# Altium footprint library ARCOM_Chips.PcbLib: 185 footprints (part 6 of 12)
Each footprint in its own frame and in the unit in brackets; x right, y up, seen from the top. Pads: shape width x height; smd on the part's side, far side on the other; paste and mask are expansions set on the pad; w line width, h text height; cw(c..) or ccw(c..) is an arc to the next point about the centre after c.
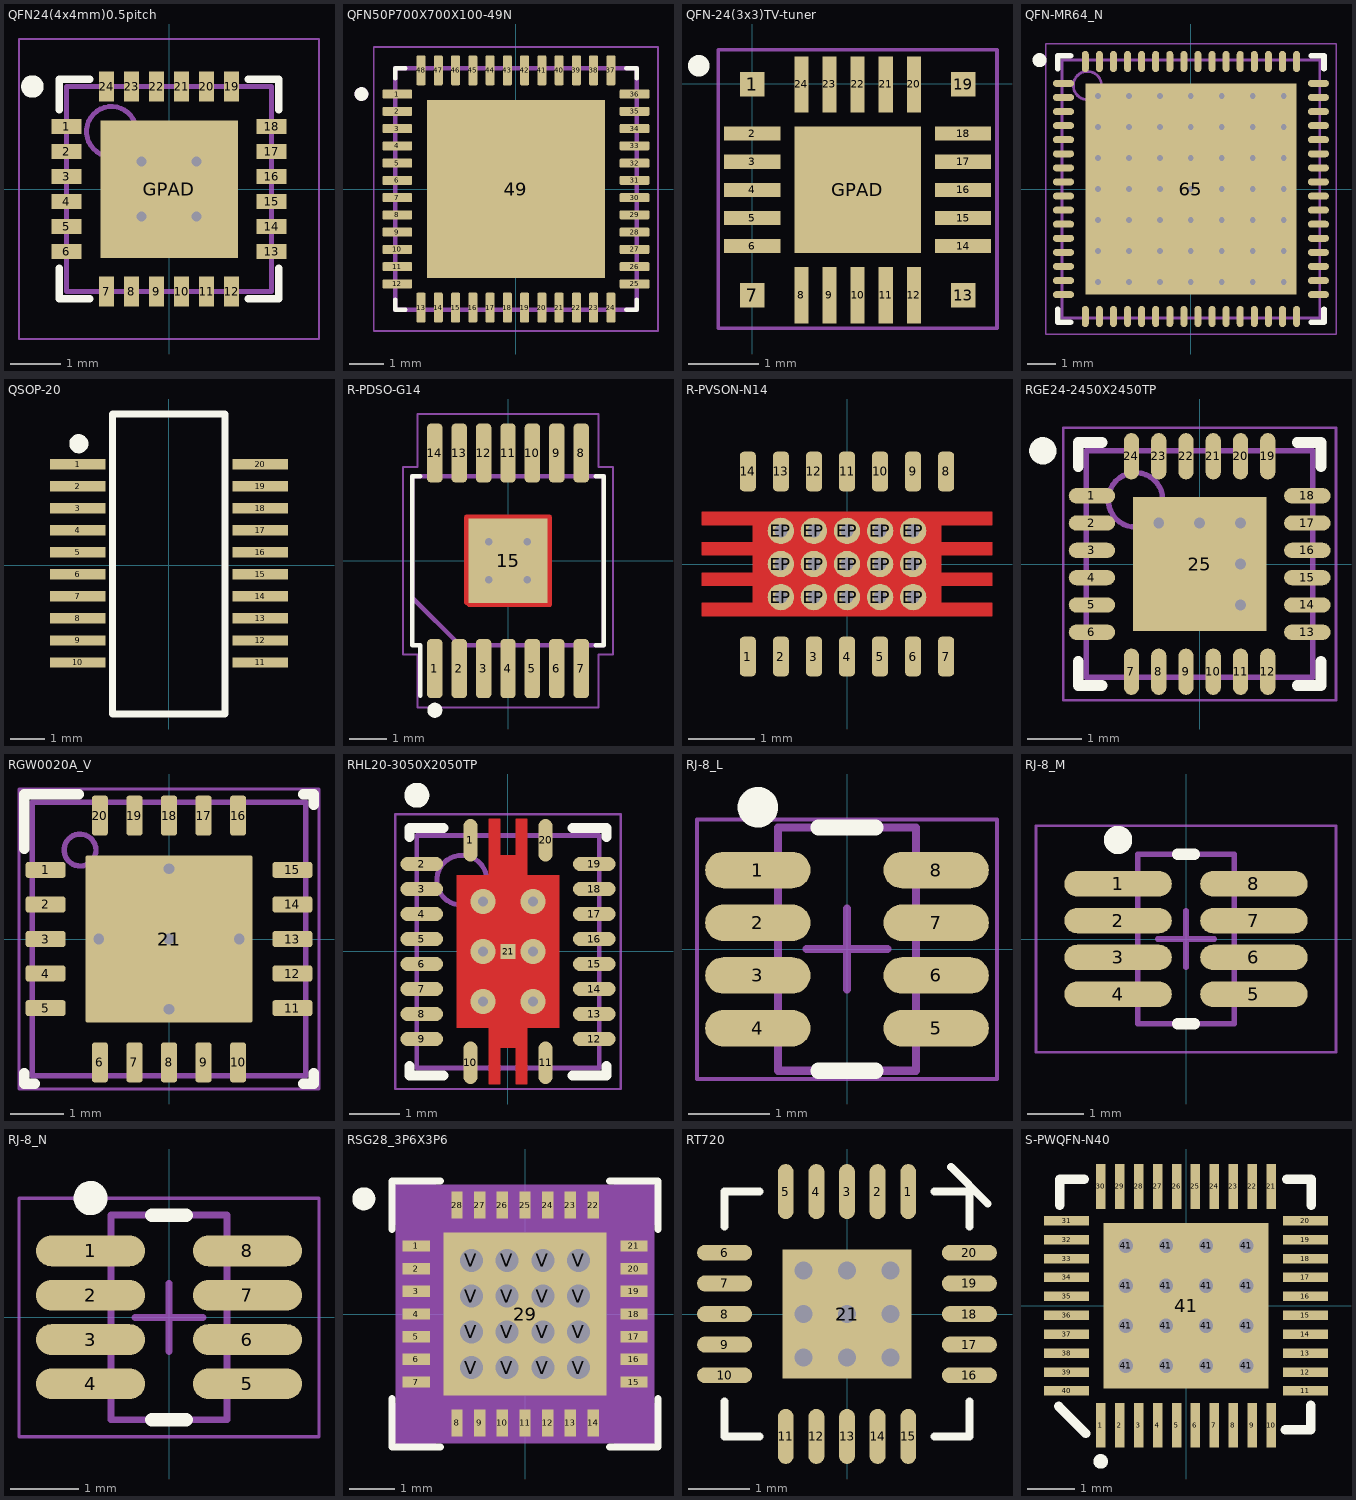
[diagram p5: the footprints below, top view; thin cyan lines are the x and y axes]

## QFN24(4x4mm)0.5pitch [mm]
pads (25):
  rect 0.6x0.3 smd mask+0.051: 1(-2.05,1.25) 2(-2.05,0.75) 3(-2.05,0.25) 4(-2.05,-0.25) 5(-2.05,-0.75) 6(-2.05,-1.25) 13(2.05,-1.25) 14(2.05,-0.75) 15(2.05,-0.25) 16(2.05,0.25) 17(2.05,0.75) 18(2.05,1.25)
  rect 0.3x0.6 smd mask+0.051: 7(-1.25,-2.05) 8(-0.75,-2.05) 9(-0.25,-2.05) 10(0.25,-2.05) 11(0.75,-2.05) 12(1.25,-2.05) 19(1.25,2.05) 20(0.75,2.05) 21(0.25,2.05) 22(-0.25,2.05) 23(-0.75,2.05) 24(-1.25,2.05)
  rect 2.75x2.75 smd mask+0.051: GPAD(0,0)
via -0.55,0.55 diameter 0.5 hole 0.2
via 0.55,0.55 diameter 0.5 hole 0.2
via -0.55,-0.55 diameter 0.5 hole 0.2
via 0.55,-0.55 diameter 0.5 hole 0.2
Top Overlay:
  circle w0.25: c-2.733,2.05 r0.1
  lines w0.15: -2.2,-1.582 -2.2,-2.2 -1.582,-2.2 ; -2.2,1.582 -2.2,2.2 -1.582,2.2 ; 1.582,-2.2 2.2,-2.2 2.2,-1.582 ; 1.582,2.2 2.2,2.2 2.2,1.582
Mechanical 13:
  circle w0.1: c-1.15,1.15 r0.5
  lines w0.1: -2.05,-2.05 -2.05,2.05 2.05,2.05 2.05,-2.05 -2.05,-2.05
M15 Top Assy:
  lines w0.05: -3,-3 -3,3 3,3 3,-3 -3,-3
  lines w0.1: -0.5,0 0.5,0 ; 0,-0.5 0,0.5
3D body "User Library-QFN 24 4x4.STEP": height 0.9, standoff 0, extent -2.002,-1.992 2.002,2.012

## QFN50P700X700X100-49N [mm]
pads (49):
  rrect25% 0.86x0.26 smd: 1(-3.435,2.75) 2(-3.435,2.25) 3(-3.435,1.75) 4(-3.435,1.25) 5(-3.435,0.75) 6(-3.435,0.25) 7(-3.435,-0.25) 8(-3.435,-0.75) 9(-3.435,-1.25) 10(-3.435,-1.75) 11(-3.435,-2.25) 12(-3.435,-2.75) 25(3.435,-2.75) 26(3.435,-2.25) 27(3.435,-1.75) 28(3.435,-1.25) 29(3.435,-0.75) 30(3.435,-0.25) 31(3.435,0.25) 32(3.435,0.75) 33(3.435,1.25) 34(3.435,1.75) 35(3.435,2.25) 36(3.435,2.75)
  rrect25% 0.26x0.86 smd: 13(-2.75,-3.435) 14(-2.25,-3.435) 15(-1.75,-3.435) 16(-1.25,-3.435) 17(-0.75,-3.435) 18(-0.25,-3.435) 19(0.25,-3.435) 20(0.75,-3.435) 21(1.25,-3.435) 22(1.75,-3.435) 23(2.25,-3.435) 24(2.75,-3.435) 37(2.75,3.435) 38(2.25,3.435) 39(1.75,3.435) 40(1.25,3.435) 41(0.75,3.435) 42(0.25,3.435) 43(-0.25,3.435) 44(-0.75,3.435) 45(-1.25,3.435) 46(-1.75,3.435) 47(-2.25,3.435) 48(-2.75,3.435)
  rect 5.15x5.15 smd paste-4: 49(0,0)
Top Overlay:
  circle w0.2: c-4.475,2.75 r0.1
  lines w0.127: -3.5,-3.2 -3.5,-3.5 -3.2,-3.5 ; -3.5,3.2 -3.5,3.5 -3.2,3.5 ; 3.2,-3.5 3.5,-3.5 3.5,-3.2 ; 3.2,3.5 3.5,3.5 3.5,3.2
Top Paste:
  region: 2.1,-2.1 0.48,-2.1 0.48,-0.48 2.1,-0.48
  region: -0.48,-2.1 -2.1,-2.1 -2.1,-0.48 -0.48,-0.48
  region: 2.1,0.48 0.48,0.48 0.48,2.1 2.1,2.1
  region: -0.48,0.48 -2.1,0.48 -2.1,2.1 -0.48,2.1
Mechanical 13:
  circle w0.2: c-4.475,2.75 r0.1
  lines w0.127: -3.5,-3.5 -3.5,3.5 3.5,3.5 3.5,-3.5 -3.5,-3.5
M15 Top Assy:
  lines w0.05: -4.115,-4.115 -4.115,4.115 4.115,4.115 4.115,-4.115 -4.115,-4.115
3D body "RGZ0048D.stp": height 1, standoff 0, extent -3.5,-3.5 3.5,3.5

## QFN-24(3x3)TV-tuner [mm]
pads (25):
  rect 0.35x0.35 smd mask+0.076: 1(-0.003,-0.011) 7(-0.003,-3.011) 13(2.997,-3.011) 19(2.997,-0.011)
  rect 0.8x0.2 smd mask+0.076: 2(-0.003,-0.711) 3(-0.003,-1.111) 4(-0.003,-1.511) 5(-0.003,-1.911) 6(-0.003,-2.311) 14(2.997,-2.311) 15(2.997,-1.911) 16(2.997,-1.511) 17(2.997,-1.111) 18(2.997,-0.711)
  rect 0.2x0.8 smd mask+0.076: 8(0.697,-3.011) 9(1.097,-3.011) 10(1.497,-3.011) 11(1.897,-3.011) 12(2.297,-3.011) 20(2.297,-0.011) 21(1.897,-0.011) 22(1.497,-0.011) 23(1.097,-0.011) 24(0.697,-0.011)
  rect 1.8x1.8 smd mask+0.076: GPAD(1.497,-1.511)
Top Overlay:
  circle w0.254: c-0.762,0.254 r0.025
M15 Top Assy:
  lines w0.05: -0.483,-3.48 3.48,-3.48 3.48,0.483 -0.483,0.483 -0.483,-3.48
  lines w0.1: 0.999,-1.524 1.999,-1.524 ; 1.499,-2.024 1.499,-1.024

## QFN-MR64_N [mm] "QFN, 64-Leads, Body 9x9mm, Pitch 0.5mm, Thermal Pad 7.5x7.5mm, IPC Medium Density"
height 1
pads (65):
  oval 0.75x0.25 smd: 1(-4.525,3.75) 2(-4.525,3.25) 3(-4.525,2.75) 4(-4.525,2.25) 5(-4.525,1.75) 6(-4.525,1.25) 7(-4.525,0.75) 8(-4.525,0.25) 9(-4.525,-0.25) 10(-4.525,-0.75) 11(-4.525,-1.25) 12(-4.525,-1.75) 13(-4.525,-2.25) 14(-4.525,-2.75) 15(-4.525,-3.25) 16(-4.525,-3.75) 33(4.525,-3.75) 34(4.525,-3.25) 35(4.525,-2.75) 36(4.525,-2.25) 37(4.525,-1.75) 38(4.525,-1.25) 39(4.525,-0.75) 40(4.525,-0.25) 41(4.525,0.25) 42(4.525,0.75) 43(4.525,1.25) 44(4.525,1.75) 45(4.525,2.25) 46(4.525,2.75) 47(4.525,3.25) 48(4.525,3.75)
  oval 0.25x0.75 smd: 17(-3.75,-4.525) 18(-3.25,-4.525) 19(-2.75,-4.525) 20(-2.25,-4.525) 21(-1.75,-4.525) 22(-1.25,-4.525) 23(-0.75,-4.525) 24(-0.25,-4.525) 25(0.25,-4.525) 26(0.75,-4.525) 27(1.25,-4.525) 28(1.75,-4.525) 29(2.25,-4.525) 30(2.75,-4.525) 31(3.25,-4.525) 32(3.75,-4.525) 49(3.75,4.525) 50(3.25,4.525) 51(2.75,4.525) 52(2.25,4.525) 53(1.75,4.525) 54(1.25,4.525) 55(0.75,4.525) 56(0.25,4.525) 57(-0.25,4.525) 58(-0.75,4.525) 59(-1.25,4.525) 60(-1.75,4.525) 61(-2.25,4.525) 62(-2.75,4.525) 63(-3.25,4.525) 64(-3.75,4.525)
  rect 7.5x7.5 smd: 65(0,0)
via -3.3,3.3 diameter 0.5 hole 0.2
via -2.2,3.3 diameter 0.5 hole 0.2
via -1.1,3.3 diameter 0.5 hole 0.2
via 0,3.3 diameter 0.5 hole 0.2
via 1.1,3.3 diameter 0.5 hole 0.2
via 2.2,3.3 diameter 0.5 hole 0.2
via 3.3,3.3 diameter 0.5 hole 0.2
via -3.3,2.2 diameter 0.5 hole 0.2
via -2.2,2.2 diameter 0.5 hole 0.2
via -1.1,2.2 diameter 0.5 hole 0.2
via 0,2.2 diameter 0.5 hole 0.2
via 1.1,2.2 diameter 0.5 hole 0.2
via 2.2,2.2 diameter 0.5 hole 0.2
via 3.3,2.2 diameter 0.5 hole 0.2
via -3.3,1.1 diameter 0.5 hole 0.2
via -2.2,1.1 diameter 0.5 hole 0.2
via -1.1,1.1 diameter 0.5 hole 0.2
via 0,1.1 diameter 0.5 hole 0.2
via 1.1,1.1 diameter 0.5 hole 0.2
via 2.2,1.1 diameter 0.5 hole 0.2
via 3.3,1.1 diameter 0.5 hole 0.2
via -3.3,0 diameter 0.5 hole 0.2
via -2.2,0 diameter 0.5 hole 0.2
via -1.1,0 diameter 0.5 hole 0.2
via 0,0 diameter 0.5 hole 0.2
via 1.1,0 diameter 0.5 hole 0.2
via 2.2,0 diameter 0.5 hole 0.2
via 3.3,0 diameter 0.5 hole 0.2
via -3.3,-1.1 diameter 0.5 hole 0.2
via -2.2,-1.1 diameter 0.5 hole 0.2
via -1.1,-1.1 diameter 0.5 hole 0.2
via 0,-1.1 diameter 0.5 hole 0.2
via 1.1,-1.1 diameter 0.5 hole 0.2
via 2.2,-1.1 diameter 0.5 hole 0.2
via 3.3,-1.1 diameter 0.5 hole 0.2
via -3.3,-2.2 diameter 0.5 hole 0.2
via -2.2,-2.2 diameter 0.5 hole 0.2
via -1.1,-2.2 diameter 0.5 hole 0.2
via 0,-2.2 diameter 0.5 hole 0.2
via 1.1,-2.2 diameter 0.5 hole 0.2
via 2.2,-2.2 diameter 0.5 hole 0.2
via 3.3,-2.2 diameter 0.5 hole 0.2
via -3.3,-3.3 diameter 0.5 hole 0.2
via -2.2,-3.3 diameter 0.5 hole 0.2
via -1.1,-3.3 diameter 0.5 hole 0.2
via 0,-3.3 diameter 0.5 hole 0.2
via 1.1,-3.3 diameter 0.5 hole 0.2
via 2.2,-3.3 diameter 0.5 hole 0.2
via 3.3,-3.3 diameter 0.5 hole 0.2
Top Overlay:
  circle w0.25: c-5.375,4.575 r0.125
  lines w0.2: -4.725,-4.275 -4.725,-4.725 -4.275,-4.725 ; -4.725,4.275 -4.725,4.725 -4.275,4.725 ; 4.275,-4.725 4.725,-4.725 4.725,-4.275 ; 4.275,4.725 4.725,4.725 4.725,4.275
Mechanical 13:
  circle w0.1: c-3.675,3.675 r0.5
  lines w0.1: -4.575,-4.575 -4.575,4.575 4.575,4.575 4.575,-4.575 -4.575,-4.575
M15 Top Assy:
  lines w0.05: -5.15,-5.15 -5.15,5.15 5.15,5.15 5.15,-5.15 -5.15,-5.15
  lines w0.1: -0.5,0 0.5,0 ; 0,-0.5 0,0.5
3D body: height 1, standoff 0, extent -4.575,-4.575 4.575,4.575

## QSOP-20 [mm]
pads (20):
  rect 1.6x0.3 smd: 1(-2.625,2.913) 2(-2.625,2.278) 3(-2.625,1.643) 4(-2.625,1.008) 5(-2.625,0.373) 6(-2.625,-0.262) 7(-2.625,-0.897) 8(-2.625,-1.532) 9(-2.625,-2.167) 10(-2.625,-2.802) 11(2.64,-2.802) 12(2.64,-2.167) 13(2.64,-1.532) 14(2.64,-0.897) 15(2.64,-0.262) 16(2.64,0.373) 17(2.64,1.008) 18(2.64,1.643) 19(2.64,2.278) 20(2.64,2.913)
Top Overlay:
  circle w0.3: c-2.592,3.506 r0.125
  lines w0.2: -1.625,-4.287 1.625,-4.287 1.625,4.363 -1.625,4.363 -1.625,-4.287

## R-PDSO-G14 [mm]
pads (15):
  rrect50% 0.41x1.57 smd paste-25.4 mask-25.4: 1(-1.95,-2.87) 2(-1.3,-2.87) 3(-0.65,-2.87) 4(0,-2.87) 5(0.65,-2.87) 6(1.3,-2.87) 7(1.95,-2.87) 8(1.95,2.87) 9(1.3,2.87) 10(0.65,2.87) 11(0,2.87) 12(-0.65,2.87) 13(-1.3,2.87) 14(-1.95,2.87)
  rect 2.11x2.26 smd mask-25.4: 15(0,0)
via -0.508,0.508 diameter 0.5 hole 0.2
via 0.508,0.508 diameter 0.5 hole 0.2
via 0.508,-0.508 diameter 0.5 hole 0.2
via -0.508,-0.508 diameter 0.5 hole 0.2
Top Layer:
  region: 1.16,0 1.16,-1.18 1.15,-1.19 1.15,-1.2 1.15,-1.21 1.14,-1.22 1.13,-1.22 1.12,-1.23 1.11,-1.23 -1.06,-1.23 -1.16,-1.13 -1.16,1.18 -1.15,1.19 -1.15,1.2 -1.15,1.21 -1.14,1.22 -1.13,1.22 -1.12,1.23 -1.11,1.23 1.1,1.23 1.11,1.23 1.12,1.23 1.13,1.22 1.14,1.22 1.15,1.21 1.15,1.2 1.15,1.19 1.16,1.18
Top Overlay:
  circle w0.2: c-1.95,-3.98 r0.1
  lines w0.12: -2.34,-3.6 -2.34,-2.25 -2.55,-2.25 -2.55,2.25 -2.34,2.25 ; 2.34,-2.25 2.55,-2.25 2.55,2.25 2.34,2.25
Top Paste:
  drawing of 18 lines, arcs and shapes, not listed
Top Solder:
  drawing of 16 lines, arcs and shapes, not listed
Mechanical 1:
  lines w0.12: -2.55,-0.98 -2.55,2.25 2.55,2.25 2.55,-2.25 -1.28,-2.25 -2.55,-0.98
M16 Bot Assy:
  circle w0.05: c0,0 r0.25
  lines w0.05: -0.35,0 0.35,0 ; 0,-0.35 0,0.35 ; -2.8,-2.5 -2.8,2.5 -2.41,2.5 -2.41,3.91 2.41,3.91 2.41,2.5 2.8,2.5 2.8,-2.5 2.41,-2.5 2.41,-3.91 -2.41,-3.91 -2.41,-2.5 -2.8,-2.5

## R-PVSON-N14 [mm]
pads (29):
  rrect50% 0.24x0.6 smd mask+0.07: 1(-1.5,-1.4) 2(-1,-1.4) 3(-0.5,-1.4) 4(0,-1.4) 5(0.5,-1.4) 6(1,-1.4) 7(1.5,-1.4) 8(1.5,1.4) 9(1,1.4) 10(0.5,1.4) 11(0,1.4) 12(-0.5,1.4) 13(-1,1.4) 14(-1.5,1.4)
  round 0.4 hole 0.2 mask-1: EP(-1,-0.5) EP(-1,0) EP(-1,0.5) EP(-0.5,-0.5) EP(-0.5,0) EP(-0.5,0.5) EP(0,-0.5) EP(0,0) EP(0,0.5) EP(0.5,-0.5) EP(0.5,0) EP(0.5,0.5) EP(1,-0.5) EP(1,0) EP(1,0.5)
Top Layer:
  region: -2.2,0.79 -2.2,0.59 -1.425,0.59 -1.425,0.33 -2.2,0.33 -2.2,0.13 -1.425,0.13 -1.425,-0.13 -2.2,-0.13 -2.2,-0.33 -1.425,-0.33 -1.425,-0.59 -2.2,-0.59 -2.2,-0.79 2.2,-0.79 2.2,-0.59 1.425,-0.59 1.425,-0.33 2.2,-0.33 2.2,-0.13 1.425,-0.13 1.425,0.13 2.2,0.13 2.2,0.33 1.425,0.33 1.425,0.59 2.2,0.59 2.2,0.79
Top Paste:
  region: -2.2,0.79 -2.2,0.59 -1.425,0.59 -1.425,0.33 -2.2,0.33 -2.2,0.13 -1.425,0.13 -1.425,-0.13 -2.2,-0.13 -2.2,-0.33 -1.425,-0.33 -1.425,-0.59 -2.2,-0.59 -2.2,-0.79 2.2,-0.79 2.2,-0.59 1.425,-0.59 1.425,-0.33 2.2,-0.33 2.2,-0.13 1.425,-0.13 1.425,0.13 2.2,0.13 2.2,0.33 1.425,0.33 1.425,0.59 2.2,0.59 2.2,0.79
Top Solder:
  region: -2.27,0.86 -2.27,0.52 -1.495,0.52 -1.495,0.4 -2.27,0.4 -2.27,0.06 -1.495,0.06 -1.495,-0.06 -2.27,-0.06 -2.27,-0.4 -1.495,-0.4 -1.495,-0.52 -2.27,-0.52 -2.27,-0.86 2.27,-0.86 2.27,-0.52 1.495,-0.52 1.495,-0.4 2.27,-0.4 2.27,-0.06 1.495,-0.06 1.495,0.06 2.27,0.06 2.27,0.4 1.495,0.4 1.495,0.52 2.27,0.52 2.27,0.86
3D body "User Library-R-PVSON-N14.STEP": height 1.05, standoff 0, extent -2.077,-1.587 2.077,1.587

## RGE24-2450X2450TP [mm] "QFN, 24-Leads, Body 4x4mm, Pitch 0.5mm, Thermal Pad 2.45x2.45mm, TI Recommended"
height 1
pads (25):
  oval 0.85x0.28 smd paste-0.025 mask+0.07: 1(-1.975,1.25) 2(-1.975,0.75) 3(-1.975,0.25) 4(-1.975,-0.25) 5(-1.975,-0.75) 6(-1.975,-1.25) 13(1.975,-1.25) 14(1.975,-0.75) 15(1.975,-0.25) 16(1.975,0.25) 17(1.975,0.75) 18(1.975,1.25)
  oval 0.28x0.85 smd paste-0.025 mask+0.07: 7(-1.25,-1.975) 8(-0.75,-1.975) 9(-0.25,-1.975) 10(0.25,-1.975) 11(0.75,-1.975) 12(1.25,-1.975) 19(1.25,1.975) 20(0.75,1.975) 21(0.25,1.975) 22(-0.25,1.975) 23(-0.75,1.975) 24(-1.25,1.975)
  rect 2.45x2.45 smd paste-1.225 mask+0.07: 25(0,0)
via 0.75,0.75 diameter 0.5 hole 0.2
via 0.75,0 diameter 0.5 hole 0.2
via -0.75,0.75 diameter 0.5 hole 0.2
via 0,0.75 diameter 0.5 hole 0.2
via 0.75,-0.75 diameter 0.5 hole 0.2
Top Overlay:
  circle w0.25: c-2.875,2.075 r0.125
  lines w0.2: -2.225,-1.79 -2.225,-2.225 -1.79,-2.225 ; -2.225,1.79 -2.225,2.225 -1.79,2.225 ; 1.79,-2.225 2.225,-2.225 2.225,-1.79 ; 1.79,2.225 2.225,2.225 2.225,1.79
Top Paste:
  rectangle: 0.15,-1.15 1.15,-0.15
  region: -0.15,-0.15 -1.15,-0.15 -1.15,-1.15 -0.15,-1.15
  region: -0.15,1.15 -1.15,1.15 -1.15,0.15 -0.15,0.15
  rectangle: 0.15,0.15 1.15,1.15
Mechanical 13:
  circle w0.1: c-1.175,1.175 r0.5
  lines w0.1: -2.075,-2.075 -2.075,2.075 2.075,2.075 2.075,-2.075 -2.075,-2.075
M15 Top Assy:
  lines w0.05: -2.5,-2.5 -2.5,2.5 2.5,2.5 2.5,-2.5 -2.5,-2.5
  lines w0.1: -0.5,0 0.5,0 ; 0,-0.5 0,0.5
3D body: height 1, standoff 0, extent -2.075,-2.075 2.075,2.075

## RGW0020A_V [mm] "QFN, 20-Leads, Body 5x5mm, Pitch 0.65mm, Thermal Pad 3.15x3.15mm, TI Recommended"
height 1
pads (21):
  rrect33% 0.75x0.3 smd: 1(-2.325,1.3) 2(-2.325,0.65) 3(-2.325,0) 4(-2.325,-0.65) 5(-2.325,-1.3) 11(2.325,-1.3) 12(2.325,-0.65) 13(2.325,0) 14(2.325,0.65) 15(2.325,1.3)
  rrect33% 0.3x0.75 smd: 6(-1.3,-2.325) 7(-0.65,-2.325) 8(0,-2.325) 9(0.65,-2.325) 10(1.3,-2.325) 16(1.3,2.325) 17(0.65,2.325) 18(0,2.325) 19(-0.65,2.325) 20(-1.3,2.325)
  rrect3% 3.15x3.15 smd paste-1.575: 21(0,0)
via 0,1.325 diameter 0.5 hole 0.2
via -1.325,0 diameter 0.5 hole 0.2
via 0,0 diameter 0.5 hole 0.2
via 1.325,0 diameter 0.5 hole 0.2
via 0,-1.325 diameter 0.5 hole 0.2
Top Overlay:
  lines w0.2: -2.725,-2.525 -2.725,-2.725 -2.525,-2.725 ; -2.725,1.7 -2.725,2.725 -1.7,2.725 ; 2.525,-2.725 2.725,-2.725 2.725,-2.525 ; 2.525,2.725 2.725,2.725 2.725,2.525
Top Paste:
  rectangle: 0.1,0.1 1.468,1.468
  region: -0.1,1.468 -1.468,1.468 -1.468,0.1 -0.1,0.1
  region: -0.1,-0.1 -1.468,-0.1 -1.468,-1.468 -0.1,-1.468
  rectangle: 0.1,-1.468 1.468,-0.1
Mechanical 1:
  text ".Designator" at -1.854,-0.508 h1.02
Mechanical 13:
  circle w0.1: c-1.675,1.675 r0.3
  lines w0.1: -2.575,-2.575 -2.575,2.575 2.575,2.575 2.575,-2.575 -2.575,-2.575
M15 Top Assy:
  lines w0.05: -2.825,-2.825 2.825,-2.825 2.825,2.825 -2.825,2.825 -2.825,-2.825
  lines w0.1: -0.5,0 0.5,0 ; 0,-0.5 0,0.5
3D body: height 1.01, standoff 0.5, extent -1.974,1.376 -1.376,1.974
3D body: height 1, standoff 0, extent -2.575,-2.575 2.575,2.575

## RHL20-3050X2050TP [mm] "QFN, 20-Leads, Body 4.5x3.5mm, Pitch 0.5mm, Thermal Pad 3.05x2.05mm, TI Recommended"
height 1
pads (21):
  oval 0.28x0.85 smd paste-0.025 mask+0.051: 1(-0.75,2.225) 10(-0.75,-2.225) 11(0.75,-2.225) 20(0.75,2.225)
  oval 0.85x0.28 smd paste-0.025 mask+0.051: 2(-1.725,1.75) 3(-1.725,1.25) 4(-1.725,0.75) 5(-1.725,0.25) 6(-1.725,-0.25) 7(-1.725,-0.75) 8(-1.725,-1.25) 9(-1.725,-1.75) 12(1.725,-1.75) 13(1.725,-1.25) 14(1.725,-0.75) 15(1.725,-0.25) 16(1.725,0.25) 17(1.725,0.75) 18(1.725,1.25) 19(1.725,1.75)
  rect 0.3x0.3 smd paste-0.15 mask+0.051: 21(0,0)
via -0.5,1 diameter 0.5 hole 0.2
via -0.5,0 diameter 0.5 hole 0.2
via -0.5,-1 diameter 0.5 hole 0.2
via 0.5,1 diameter 0.5 hole 0.2
via 0.5,0 diameter 0.5 hole 0.2
via 0.5,-1 diameter 0.5 hole 0.2
Top Layer:
  region: 0.16,2.65 0.16,1.925 -0.16,1.925 -0.16,2.65 -0.39,2.65 -0.39,1.525 -1.025,1.525 -1.025,-1.525 -0.39,-1.525 -0.39,-2.65 -0.16,-2.65 -0.16,-1.925 0.16,-1.925 0.16,-2.65 0.39,-2.65 0.39,-1.525 1.025,-1.525 1.025,1.525 0.39,1.525 0.39,2.65
Top Overlay:
  circle w0.25: c-1.825,3.125 r0.125
  lines w0.2: -1.975,-2.29 -1.975,-2.475 -1.29,-2.475 ; -1.975,2.29 -1.975,2.475 -1.29,2.475 ; 1.29,-2.475 1.975,-2.475 1.975,-2.29 ; 1.29,2.475 1.975,2.475 1.975,2.29
Top Paste:
  region: -0.39,2.625 -0.39,1.725 -0.16,1.725 -0.16,2.625
  region: -0.16,-2.625 -0.16,-1.725 -0.39,-1.725 -0.39,-2.625
  region: 0.16,2.625 0.16,1.725 0.39,1.725 0.39,2.625
  region: 0.39,-2.625 0.39,-1.725 0.16,-1.725 0.16,-2.625
  region: -0.97,1.47 -0.97,0.15 -0.15,0.15 -0.15,1.47
  region: -0.15,-1.47 -0.15,-0.15 -0.97,-0.15 -0.97,-1.47
  region: 0.97,-1.47 0.97,-0.15 0.15,-0.15 0.15,-1.47
  region: 0.15,1.47 0.15,0.15 0.97,0.15 0.97,1.47
Mechanical 13:
  circle w0.1: c-0.925,1.425 r0.5
  lines w0.1: -1.825,-2.325 1.825,-2.325 1.825,2.325 -1.825,2.325 -1.825,-2.325
M15 Top Assy:
  lines w0.05: -2.25,-2.75 2.25,-2.75 2.25,2.75 -2.25,2.75 -2.25,-2.75
  lines w0.1: -0.5,0 0.5,0 ; 0,-0.5 0,0.5
3D body: height 1, standoff 0, extent -1.825,-2.325 1.825,2.325

## RJ-8_L [mm] "SOP, 8-Leads, Body 2.9x1.6mm, Pitch 0.65mm, IPC High Density"
height 1.45
pads (8):
  oval 1.3x0.45 smd: 1(-1.1,0.975) 2(-1.1,0.325) 3(-1.1,-0.325) 4(-1.1,-0.975) 5(1.1,-0.975) 6(1.1,-0.325) 7(1.1,0.325) 8(1.1,0.975)
Top Overlay:
  circle w0.25: c-1.1,1.75 r0.125
  lines w0.2: -0.35,-1.5 0.35,-1.5 ; -0.35,1.5 0.35,1.5
Mechanical 13:
  lines w0.1: -0.85,-1.5 -0.85,1.5 0.85,1.5 0.85,-1.5 -0.85,-1.5
M15 Top Assy:
  lines w0.05: -1.85,-1.6 -1.85,1.6 1.85,1.6 1.85,-1.6 -1.85,-1.6
  lines w0.1: -0.5,0 0.5,0 ; 0,-0.5 0,0.5
3D body: height 1.45, standoff 0.05, extent -0.85,-1.5 0.85,1.5

## RJ-8_M [mm] "SOP, 8-Leads, Body 2.9x1.6mm, Pitch 0.65mm, IPC Low Density"
height 1.45
pads (8):
  oval 1.9x0.45 smd: 1(-1.2,0.975) 2(-1.2,0.325) 3(-1.2,-0.325) 4(-1.2,-0.975) 5(1.2,-0.975) 6(1.2,-0.325) 7(1.2,0.325) 8(1.2,0.975)
Top Overlay:
  circle w0.25: c-1.2,1.75 r0.125
  lines w0.2: -0.15,-1.5 0.15,-1.5 ; -0.15,1.5 0.15,1.5
Mechanical 13:
  lines w0.1: -0.85,-1.5 0.85,-1.5 0.85,1.5 -0.85,1.5 -0.85,-1.5
M15 Top Assy:
  lines w0.05: -2.65,-2 2.65,-2 2.65,2 -2.65,2 -2.65,-2
  lines w0.1: -0.5,0 0.5,0 ; 0,-0.5 0,0.5
3D body: height 1.45, standoff 0.05, extent -0.85,-1.5 0.85,1.5

## RJ-8_N [mm] "SOP, 8-Leads, Body 2.9x1.6mm, Pitch 0.65mm, IPC Medium Density"
height 1.45
pads (8):
  oval 1.6x0.45 smd: 1(-1.15,0.975) 2(-1.15,0.325) 3(-1.15,-0.325) 4(-1.15,-0.975) 5(1.15,-0.975) 6(1.15,-0.325) 7(1.15,0.325) 8(1.15,0.975)
Top Overlay:
  circle w0.25: c-1.15,1.75 r0.125
  lines w0.2: -0.25,-1.5 0.25,-1.5 ; -0.25,1.5 0.25,1.5
Mechanical 13:
  lines w0.1: -0.85,-1.5 0.85,-1.5 0.85,1.5 -0.85,1.5 -0.85,-1.5
M15 Top Assy:
  lines w0.05: -2.2,-1.75 2.2,-1.75 2.2,1.75 -2.2,1.75 -2.2,-1.75
  lines w0.1: -0.5,0 0.5,0 ; 0,-0.5 0,0.5
3D body: height 1.45, standoff 0.05, extent -0.85,-1.5 0.85,1.5

## RSG28_3P6X3P6 [mm]
pads (45):
  rect 0.6x0.25 smd paste-0.125: 1(-2.4,1.5) 2(-2.4,1) 3(-2.4,0.5) 4(-2.4,0) 5(-2.4,-0.5) 6(-2.4,-1) 7(-2.4,-1.5) 15(2.4,-1.5) 16(2.4,-1) 17(2.4,-0.5) 18(2.4,0) 19(2.4,0.5) 20(2.4,1) 21(2.4,1.5)
  rect 0.25x0.6 smd paste-0.125: 8(-1.5,-2.4) 9(-1,-2.4) 10(-0.5,-2.4) 11(0,-2.4) 12(0.5,-2.4) 13(1,-2.4) 14(1.5,-2.4) 22(1.5,2.4) 23(1,2.4) 24(0.5,2.4) 25(0,2.4) 26(-0.5,2.4) 27(-1,2.4) 28(-1.5,2.4)
  rect 3.6x3.6 smd paste-1.787 mask-1.791: 29(0,0)
  round 1.016 / inner round 1.524 / far side round 1.016 hole 0.508: V(-1.181,-1.181) V(-1.181,-0.394) V(-1.181,0.394) V(-1.181,1.181) V(-0.394,-1.181) V(-0.394,-0.394) V(-0.394,0.394) V(-0.394,1.181) V(0.394,-1.181) V(0.394,-0.394) V(0.394,0.394) V(0.394,1.181) V(1.181,-1.181) V(1.181,-0.394) V(1.181,0.394) V(1.181,1.181)
Top Overlay:
  circle w0.254: c-3.556,2.54 r0.127
  lines w0.152: -2.931,-1.864 -2.931,-2.931 -1.864,-2.931 ; -2.931,1.864 -2.931,2.931 -1.864,2.931 ; 1.864,-2.931 2.931,-2.931 2.931,-1.864 ; 1.864,2.931 2.931,2.931 2.931,1.864
Top Paste:
  drawing of 53 lines, arcs and shapes, not listed
Top Solder:
  drawing of 38 lines, arcs and shapes, not listed
Mechanical 13:
  text ".Designator" at -2.667,0 h1.27
M15 Top Assy:
  region: -2.008,-2.804 -2.804,-2.804 -2.804,-2.008 -2.779,-2.008 -2.779,2.008 -2.804,2.008 -2.804,2.804 -2.008,2.804 -2.008,2.779 2.008,2.779 2.008,2.804 2.804,2.804 2.804,2.008 2.779,2.008 2.779,-2.008 2.804,-2.008 2.804,-2.804 2.008,-2.804 2.008,-2.779 -2.008,-2.779
  lines w0.152: -2.804,-2.804 -2.804,-2.008 -2.779,-2.008 -2.779,2.008 -2.804,2.008 -2.804,2.804 -2.008,2.804 -2.008,2.779 2.008,2.779 2.008,2.804 2.804,2.804 2.804,2.008 2.779,2.008 2.779,-2.008 2.804,-2.008 2.804,-2.804 2.008,-2.804 2.008,-2.779 -2.008,-2.779 -2.008,-2.804 -2.804,-2.804
3D body "RSG28_3P6X3P6.stp": height 1.4, standoff 0, extent -2.601,-2.601 2.601,2.601

## RT720 [mm]
pads (21):
  oval 0.26x0.9 smd: 1(1,2) 2(0.5,2) 3(0,2) 4(-0.5,2) 5(-1,2) 11(-1,-2) 12(-0.5,-2) 13(0,-2) 14(0.5,-2) 15(1,-2)
  oval 0.9x0.26 smd: 6(-2,1) 7(-2,0.5) 8(-2,0) 9(-2,-0.5) 10(-2,-1) 16(2,-1) 17(2,-0.5) 18(2,0) 19(2,0.5) 20(2,1)
  rect 2.1x2.1 / inner round 0 / far side rect 2.55x2.55 all layers, no hole mask+0.102: 21(0,0)
via 0.711,0 diameter 0.5 hole 0.3
via 0,-0.711 diameter 0.5 hole 0.3
via -0.711,0 diameter 0.5 hole 0.3
via 0,0.711 diameter 0.5 hole 0.3
via 0,0 diameter 0.5 hole 0.3
via 0.711,-0.711 diameter 0.5 hole 0.3
via -0.711,-0.711 diameter 0.5 hole 0.3
via 0.711,0.711 diameter 0.5 hole 0.3
via -0.711,0.711 diameter 0.5 hole 0.3
Top Overlay:
  lines w0.127: -2,-1.429 -2,-2 -1.429,-2 ; -2,1.429 -2,2 -1.429,2 ; 1.429,-2 2,-2 2,-1.429 ; 1.429,2 2,2 2,1.429 ; 1.7,2.4 2.3,1.8
3D body "User Library-QFN20_050.STEP": height 0.9, standoff 0, extent -2.005,-2.005 2.005,2.005

## S-PWQFN-N40 [mm]
pads (57):
  rect 0.2x0.95 smd: 1(-1.8,-2.525) 2(-1.4,-2.525) 3(-1,-2.525) 4(-0.6,-2.525) 5(-0.2,-2.525) 6(0.2,-2.525) 7(0.6,-2.525) 8(1,-2.525) 9(1.4,-2.525) 10(1.8,-2.525) 21(1.8,2.525) 22(1.4,2.525) 23(1,2.525) 24(0.6,2.525) 25(0.2,2.525) 26(-0.2,2.525) 27(-0.6,2.525) 28(-1,2.525) 29(-1.4,2.525) 30(-1.8,2.525)
  rect 0.95x0.2 smd: 11(2.525,-1.8) 12(2.525,-1.4) 13(2.525,-1) 14(2.525,-0.6) 15(2.525,-0.2) 16(2.525,0.2) 17(2.525,0.6) 18(2.525,1) 19(2.525,1.4) 20(2.525,1.8) 31(-2.525,1.8) 32(-2.525,1.4) 33(-2.525,1) 34(-2.525,0.6) 35(-2.525,0.2) 36(-2.525,-0.2) 37(-2.525,-0.6) 38(-2.525,-1) 39(-2.525,-1.4) 40(-2.525,-1.8)
  round 0.305 hole 0.305: 41(-1.27,-1.27) 41(-1.27,-0.423) 41(-1.27,0.423) 41(-1.27,1.27) 41(-0.423,-1.27) 41(-0.423,-0.423) 41(-0.423,0.423) 41(-0.423,1.27) 41(0.423,-1.27) 41(0.423,-0.423) 41(0.423,0.423) 41(0.423,1.27) 41(1.27,-1.27) 41(1.27,-0.423) 41(1.27,0.423) 41(1.27,1.27)
  rect 3.5x3.5 smd: 41(0,0)
Top Overlay:
  circle w0.2: c-1.805,-3.29 r0.055
  lines w0.2: -2.695,-2.125 -2.12,-2.7 ; -2.67,2.125 -2.67,2.675 -2.155,2.675 ; 2.095,-2.62 2.64,-2.62 2.64,-2.105 ; 2.13,2.675 2.645,2.675 2.645,2.13
3D body "TPS65023QRSBRQ1.step": height 0.8, standoff 0, extent -2.495,-2.506 2.505,2.494